# Altium footprint library SMotlaq-PCB_lib.PcbLib: 186 footprints (part 4 of 12)
Each footprint in its own frame and in the unit in brackets; x right, y up, seen from the top. Pads: shape width x height; smd on the part's side, far side on the other; paste and mask are expansions set on the pad; w line width, h text height; cw(c..) or ccw(c..) is an arc to the next point about the centre after c.
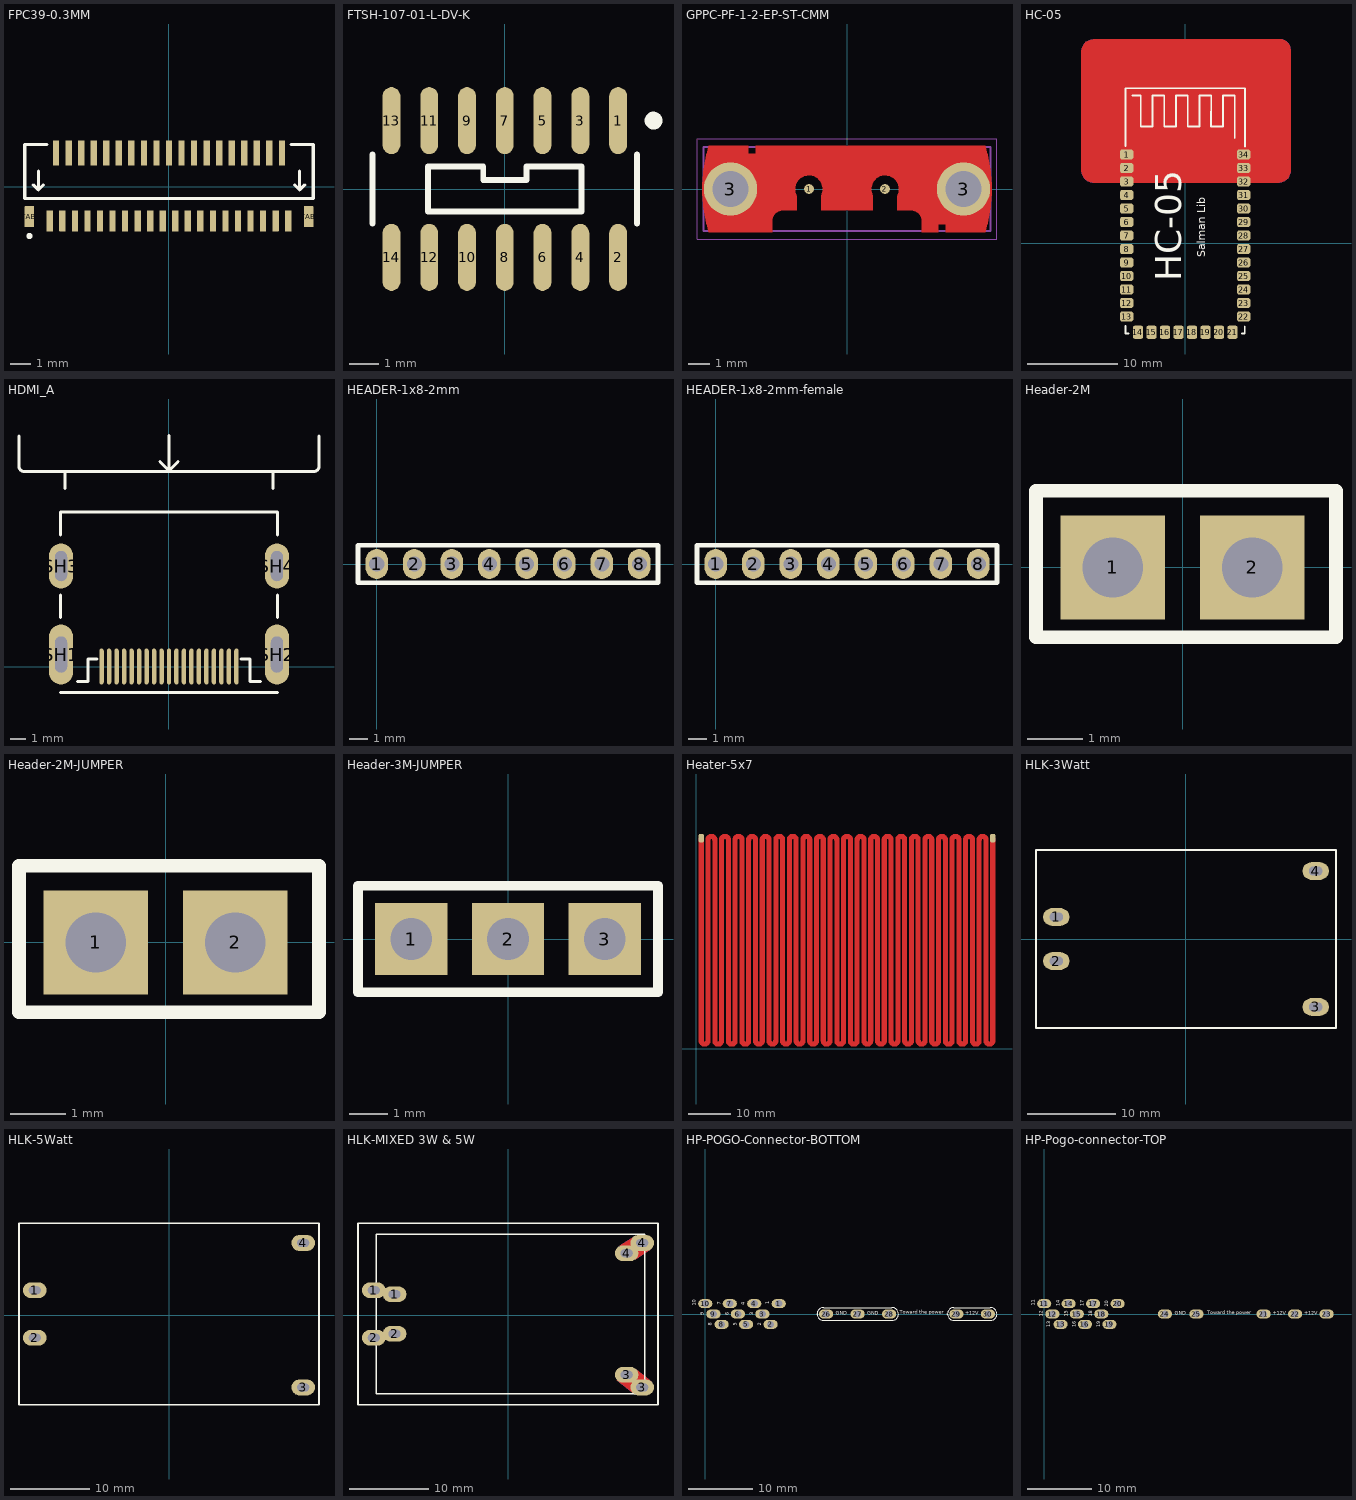
[diagram p3: the footprints below, top view; thin cyan lines are the x and y axes]

## FPC39-0.3MM [mm]
pads (41):
  rrect5% 0.3x1 smd: 1(-5.7,-1.625) 3(-5.1,-1.625) 5(-4.5,-1.625) 7(-3.9,-1.625) 9(-3.3,-1.625) 11(-2.7,-1.625) 13(-2.1,-1.625) 15(-1.5,-1.625) 17(-0.9,-1.625) 19(-0.3,-1.625) 21(0.3,-1.625) 23(0.9,-1.625) 25(1.5,-1.625) 27(2.1,-1.625) 29(2.7,-1.625) 31(3.3,-1.625) 33(3.9,-1.625) 35(4.5,-1.625) 37(5.1,-1.625) 39(5.7,-1.625)
  rrect5% 0.3x1.2 smd: 2(-5.4,1.625) 4(-4.8,1.625) 6(-4.2,1.625) 8(-3.6,1.625) 10(-3,1.625) 12(-2.4,1.625) 14(-1.8,1.625) 16(-1.2,1.625) 18(-0.6,1.625) 20(0,1.625) 22(0.6,1.625) 24(1.2,1.625) 26(1.8,1.625) 28(2.4,1.625) 30(3,1.625) 32(3.6,1.625) 34(4.2,1.625) 36(4.8,1.625) 38(5.4,1.625)
  rrect5% 0.45x1 smd: TAB(-6.675,-1.425) TAB(6.675,-1.425)
Top Overlay:
  circle w0.15: c-6.675,-2.35 r0.075
  lines w0.15: -6.5,0.1 -6.25,-0.15 ; -6.25,0.75 -6.25,-0.15 ; -6,0.1 -6.25,-0.15 ; -5.85,2.025 -6.9,2.025 -6.9,-0.55 6.9,-0.55 6.9,2.025 5.85,2.025 ; 6,0.1 6.25,-0.15 ; 6.25,0.75 6.25,-0.15 ; 6.5,0.1 6.25,-0.15
3D body "502598-3993.stp": height 1.16, standoff 0.01, extent -6.9,-1.775 6.9,2.025

## FTSH-107-01-L-DV-K [mm]
pads (14):
  rrect100% 0.6x2.25 smd mask+0.1: 1(3.81,2.3) 2(3.81,-2.3) 3(2.54,2.3) 4(2.54,-2.3) 5(1.27,2.3) 6(1.27,-2.3) 7(0,2.3) 8(0,-2.3) 9(-1.27,2.3) 10(-1.27,-2.3) 11(-2.54,2.3) 12(-2.54,-2.3) 13(-3.81,2.3) 14(-3.81,-2.3)
Top Overlay:
  circle w0.3: c5,2.3 r0.15
  lines w0.2: -4.45,-1.162 -4.45,1.162 ; 4.45,-1.162 4.45,1.162 ; 2.575,0.75 0.725,0.75 0.725,0.3 -0.725,0.3 -0.725,0.75 -2.575,0.75 -2.575,-0.75 2.575,-0.75 2.575,0.75 ; 2.575,0.75 2.575,0.75
3D body "FTSH-107-01-L-DV-K-TR.stp": height 6.11, standoff -0.01, extent -4.445,-2.921 4.445,2.921

## GPPC-PF-1-2-EP-ST-CMM [mm]
pads (4):
  round 0.46 smd paste-2539.97: 1(-1.78,0) 2(1.78,0)
  round 2.5 hole 1.7: 3(-5.46,0) 3(5.46,0)
Top Layer:
  region: 200 vertices and 0 holes, not listed, extent -6.78,-2.02 6.78,2.02
Top Solder:
  drawing of 1 lines, arcs and shapes, not listed
Mechanical 13:
  lines w0.1: -6.731,-1.97 6.731,-1.97 6.731,1.97 -6.731,1.97 -6.731,-1.97
Mechanical 15:
  lines w0.05: -7.03,-2.36 7.03,-2.36 7.03,2.36 -7.03,2.36 -7.03,-2.36
3D body "GPPC-PF-1-2-EP-ST-CMM.stp": height 6.21, standoff -3.2, extent -6.756,-2.102 6.756,2.102

## HC-05 [mm]
pads (34):
  rrect50% 1.5x1.15 smd: 1(-6.5,9.875) 2(-6.5,8.375) 3(-6.5,6.875) 4(-6.5,5.375) 5(-6.5,3.875) 6(-6.5,2.375) 7(-6.5,0.875) 8(-6.5,-0.625) 9(-6.5,-2.125) 10(-6.5,-3.625) 11(-6.5,-5.125) 12(-6.5,-6.625) 13(-6.5,-8.125) 22(6.5,-8.125) 23(6.5,-6.625) 24(6.5,-5.125) 25(6.5,-3.625) 26(6.5,-2.125) 27(6.5,-0.625) 28(6.5,0.875) 29(6.5,2.375) 30(6.5,3.875) 31(6.5,5.375) 32(6.5,6.875) 33(6.5,8.375) 34(6.5,9.875)
  rrect50% 1.15x1.5 smd: 14(-5.25,-9.875) 15(-3.75,-9.875) 16(-2.25,-9.875) 17(-0.75,-9.875) 18(0.75,-9.875) 19(2.25,-9.875) 20(3.75,-9.875) 21(5.25,-9.875)
Top Layer:
  pour cut-out: 11.75,8.175 11.75,21.375 11.75,21.507 11.699,21.765 11.598,22.009 11.451,22.228 11.265,22.414 11.046,22.56 10.803,22.661 10.544,22.712 10.412,22.712 10.413,22.712 -10.088,22.712 -10.234,22.712 -10.521,22.655 -10.792,22.543 -11.036,22.38 -11.243,22.173 -11.406,21.93 -11.518,21.659 -11.575,21.372 -11.575,21.225 -11.575,8.2 -11.575,8.056 -11.519,7.773 -11.409,7.507 -11.248,7.268 -11.045,7.064 -10.805,6.904 -10.539,6.794 -10.257,6.738 -10.112,6.738 10.312,6.737 10.454,6.737 10.732,6.793 10.993,6.901 11.229,7.058 11.429,7.259 11.586,7.494 11.695,7.756 11.75,8.033
Bottom Layer:
  pour cut-out: 11.75,8.175 11.75,21.375 11.75,21.507 11.699,21.765 11.598,22.009 11.451,22.228 11.265,22.414 11.046,22.56 10.803,22.661 10.544,22.712 10.412,22.712 10.413,22.712 -10.088,22.712 -10.234,22.712 -10.521,22.655 -10.792,22.543 -11.036,22.38 -11.243,22.173 -11.406,21.93 -11.518,21.659 -11.575,21.372 -11.575,21.225 -11.575,8.2 -11.575,8.056 -11.519,7.773 -11.409,7.507 -11.248,7.268 -11.045,7.064 -10.805,6.904 -10.539,6.794 -10.257,6.738 -10.112,6.738 10.312,6.737 10.454,6.737 10.732,6.793 10.993,6.901 11.229,7.058 11.429,7.259 11.586,7.494 11.695,7.756 11.75,8.033
Top Overlay:
  lines w0.2: -6.65,10.825 -6.65,17.25 6.65,17.25 6.65,10.75 ; -6.625,-9.175 -6.625,-10 -6.3,-10 ; -5.85,16.45 -4.95,16.45 -4.95,12.975 -3.644,12.975 ; -3.644,13 -3.644,16.45 -2.338,16.45 -2.338,13 -1.025,13 ; -1.025,12.975 -1.031,16.45 0.275,16.45 ; 1.581,16.45 1.6,12.975 ; 2.875,12.975 2.887,16.45 ; 5.5,11.675 5.5,16.45 4.194,16.45 4.194,12.975 2.887,12.975 2.887,16.45 ; 6.275,-10 6.625,-10 6.625,-9.225 ; 0.275,12.975 0.275,16.45 ; 0.275,12.975 0.275,16.45 ; 0.275,12.975 1.6,12.975 ; 1.6,12.975 1.6,16.45 2.887,16.45
  text "HC-05" at 0.544,-4.225 h5
  text "Salman Lib" at 2.558,-1.55 h1.5
3D body "User Library-HC05(06).STEP": height 4.31, standoff 0, extent -6.5,-9.875 6.5,17.125

## HDMI_A [mm] "CONN, HDMI, TYPE A, 19PIN"
pads (23):
  oval 0.3x2.4 smd mask+0.025: 1(-4.5,0) 2(-4,0) 3(-3.5,0) 4(-3,0) 5(-2.5,0) 6(-2,0) 7(-1.5,0) 8(-1,0) 9(-0.5,0) 10(0,0) 11(0.5,0) 12(1,0) 13(1.5,0) 14(2,0) 15(2.5,0) 16(3,0) 17(3.5,0) 18(4,0) 19(4.5,0)
  oval 1.6x4 hole 0.8 slot 2.4 at 90 deg: SH1(-7.2,0.8) SH2(7.2,0.8)
  oval 1.6x3 hole 0.8 slot 2 at 90 deg: SH3(-7.2,6.7) SH4(7.2,6.7)
Top Overlay:
  lines w0.2: -10,13.31 -10,15.36 ; -10,13.36 ccw(c-9.675,13.335) -9.7,13.01 9.7,13.01 ccw(c9.675,13.335) 10,13.36 10,15.36 ; -7.25,-1.74 7.25,-1.74 ; -7.25,3.26 -7.25,4.76 ; -7.25,8.76 -7.25,10.26 ; -7.25,10.31 7.2,10.31 7.25,10.26 7.25,8.76 ; -6.95,11.86 -6.95,13.01 ; -6.1,-1 -5.4,-1 -5.4,0.5 -4.8,0.5 ; -0.6,13.66 0,13.06 ; 0,15.41 0,13.06 ; 0.6,13.66 0,13.06 ; 4.8,0.5 5.4,0.5 5.4,-1 6.1,-1 ; 6.95,11.86 6.95,13.01 ; 7.25,3.26 7.25,4.76
3D body "685119134923.stp": height 6.17, standoff -2.21, extent -7.5,-0.75 7.5,11.4

## HEADER-1x8-2mm [mm]
pads (8):
  oval 1.2x1.6 hole 0.8: 1(0,0) 2(2,0) 3(4,0) 4(6,0) 5(8,0) 6(10,0) 7(12,0) 8(14,0)
Top Overlay:
  lines w0.254: -1,-1 -1,1 15,1 15,-1 -1,-1
3D body "pin_header_a-sl200-eg-g08d.stp": height 2.4, standoff -6.4, extent -0.95,-1.025 15,0.975

## HEADER-1x8-2mm-female [mm]
pads (8):
  oval 1.2x1.6 hole 0.8: 1(0,0) 2(2,0) 3(4,0) 4(6,0) 5(8,0) 6(10,0) 7(12,0) 8(14,0)
Top Overlay:
  lines w0.254: -1,-1 15,-1 15,1 -1,1 -1,-1
3D body "female_header_a-bl200-eg-g08d.stp": height 4.06, standoff -2.74, extent -1.25,-1.25 15.25,1.25

## Header-2M [mm]
pads (2):
  rect 1.9x1.9 hole 1.1: 1(-1.27,0) 2(1.27,0)
Top Overlay:
  lines w0.254: -2.667,-1.27 -2.667,1.397 2.794,1.397 2.794,-1.27 -2.667,-1.27
3D body "pin_header_aw140-eg-g02d.stp": height 8.2, standoff -3, extent -2.44,-1.246 2.64,1.253

## Header-2M-JUMPER [mm]
pads (2):
  rect 1.9x1.9 hole 1.1: 1(-1.27,0) 2(1.27,0)
Top Overlay:
  lines w0.254: -2.667,-1.27 -2.667,1.397 2.794,1.397 2.794,-1.27 -2.667,-1.27
3D body "pin_header_aw140-eg-g02d.stp": height 8.2, standoff -3, extent -2.44,-1.246 2.64,1.253
3D body "jumper_akspt_g-black.stp": height 8.57, standoff 2.6, extent -2.39,-1.216 2.59,1.224

## Header-3M-JUMPER [mm]
pads (3):
  rect 1.9x1.9 hole 1.1: 1(-2.54,0) 2(0,0) 3(2.54,0)
Top Overlay:
  lines w0.254: -3.937,-1.397 3.937,-1.397 3.937,1.397 -3.937,1.397 -3.937,-1.397
3D body "User Library-Header_Male_3Pin.STEP": height 8.54, standoff -3, extent -3.81,-1.245 3.81,1.245
3D body "jumper_akspt_g-black.stp": height 8.37, standoff 2.4, extent -3.76,-1.22 1.22,1.22

## Heater-5x7 [mm]
pads (2):
  rrect50% 1.2x2 smd mask+0.102: 1(1.125,49.675) 2(69.925,49.675)
Top Layer:
  lines w1.2: 1.125,49.3 1.125,1.875 ccw(c1.925,1.875) 1.925,1.075 ccw(c1.925,1.875) 2.725,1.875 2.725,49.3 cw(c3.525,49.3) 3.525,50.1 cw(c3.525,49.3) 4.325,49.3 4.325,1.875 ccw(c5.125,1.875) 5.125,1.075 ccw(c5.125,1.875) 5.925,1.875 5.925,49.3 cw(c6.725,49.3) 6.725,50.1 cw(c6.725,49.3) 7.525,49.3 7.525,1.875 ccw(c8.325,1.875) 8.325,1.075 ccw(c8.325,1.875) 9.125,1.875 9.125,49.3 cw(c9.925,49.3) 9.925,50.1 cw(c9.925,49.3) 10.725,49.3 10.725,1.875 ccw(c11.525,1.875) 11.525,1.075 ccw(c11.525,1.875) 12.325,1.875 12.325,49.3 cw(c13.125,49.3) 13.125,50.1 cw(c13.125,49.3) 13.925,49.3 13.925,1.875 ccw(c14.725,1.875) 14.725,1.075 ccw(c14.725,1.875) 15.525,1.875 15.525,49.3 cw(c16.325,49.3) 16.325,50.1 cw(c16.325,49.3) 17.125,49.3 17.125,1.875 ccw(c17.925,1.875) 17.925,1.075 ccw(c17.925,1.875) 18.725,1.875 18.725,49.3 cw(c19.525,49.3) 19.525,50.1 cw(c19.525,49.3) 20.325,49.3 20.325,1.875 ccw(c21.125,1.875) 21.125,1.075 ccw(c21.125,1.875) 21.925,1.875 21.925,49.3 cw(c22.725,49.3) 22.725,50.1 cw(c22.725,49.3) 23.525,49.3 23.525,1.875 ccw(c24.325,1.875) 24.325,1.075 ccw(c24.325,1.875) 25.125,1.875 25.125,49.3 cw(c25.925,49.3) 25.925,50.1 cw(c25.925,49.3) 26.725,49.3 26.725,1.875 ccw(c27.525,1.875) 27.525,1.075 ccw(c27.525,1.875) 28.325,1.875 28.325,49.3 cw(c29.125,49.3) 29.125,50.1 cw(c29.125,49.3) 29.925,49.3 29.925,1.875 ccw(c30.725,1.875) 30.725,1.075 ccw(c30.725,1.875) 31.525,1.875 31.525,49.3 cw(c32.325,49.3) 32.325,50.1 cw(c32.325,49.3) 33.125,49.3 33.125,1.875 ccw(c33.925,1.875) 33.925,1.075 ccw(c33.925,1.875) 34.725,1.875 34.725,49.3 cw(c35.525,49.3) 35.525,50.1 cw(c35.525,49.3) 36.325,49.3 36.325,1.875 ccw(c37.125,1.875) 37.125,1.075 ccw(c37.125,1.875) 37.925,1.875 37.925,49.3 cw(c38.725,49.3) 38.725,50.1 cw(c38.725,49.3) 39.525,49.3 39.525,1.875 ccw(c40.325,1.875) 40.325,1.075 ccw(c40.325,1.875) 41.125,1.875 41.125,49.3 cw(c41.925,49.3) 41.925,50.1 cw(c41.925,49.3) 42.725,49.3 42.725,1.875 ccw(c43.525,1.875) 43.525,1.075 ccw(c43.525,1.875) 44.325,1.875 44.325,49.3 cw(c45.125,49.3) 45.125,50.1 cw(c45.125,49.3) 45.925,49.3 45.925,1.875 ccw(c46.725,1.875) 46.725,1.075 ccw(c46.725,1.875) 47.525,1.875 47.525,49.3 cw(c48.325,49.3) 48.325,50.1 cw(c48.325,49.3) 49.125,49.3 49.125,1.875 ccw(c49.925,1.875) 49.925,1.075 ccw(c49.925,1.875) 50.725,1.875 50.725,49.3 cw(c51.525,49.3) 51.525,50.1 cw(c51.525,49.3) 52.325,49.3 52.325,1.875 ccw(c53.125,1.875) 53.125,1.075 ccw(c53.125,1.875) 53.925,1.875 53.925,49.3 cw(c54.725,49.3) 54.725,50.1 cw(c54.725,49.3) 55.525,49.3 55.525,1.875 ccw(c56.325,1.875) 56.325,1.075 ccw(c56.325,1.875) 57.125,1.875 57.125,49.3 cw(c57.925,49.3) 57.925,50.1 cw(c57.925,49.3) 58.725,49.3 58.725,1.875 ccw(c59.525,1.875) 59.525,1.075 ccw(c59.525,1.875) 60.325,1.875 60.325,49.3 cw(c61.125,49.3) 61.125,50.1 cw(c61.125,49.3) 61.925,49.3 61.925,1.875 ccw(c62.725,1.875) 62.725,1.075 ccw(c62.725,1.875) 63.525,1.875 63.525,49.3 cw(c64.325,49.3) 64.325,50.1 cw(c64.325,49.3) 65.125,49.3 65.125,1.875 ccw(c65.925,1.875) 65.925,1.075 ccw(c65.925,1.875) 66.725,1.875 66.725,49.3 cw(c67.525,49.3) 67.525,50.1 cw(c67.525,49.3) 68.325,49.3 68.325,1.875 ccw(c69.125,1.875) 69.125,1.075 ccw(c69.125,1.875) 69.925,1.875 69.925,49.3

## HLK-3Watt [mm]
pads (4):
  oval 3x2 / inner oval 3x2 / far side oval 3.5x2.2 hole 1 slot 1.5 at 0 deg: 1(-14.7,2.5) 2(-14.7,-2.5) 3(14.7,-7.7) 4(14.7,7.7)
Top Overlay:
  lines w0.2: -17,-10.1 17,-10.1 17,10.1 -17,10.1 -17,-10.1
3D body "User Library-HLK-PM01.STEP": height 15.1, standoff -5, extent -16.95,-10.15 17.05,10.05

## HLK-5Watt [mm]
pads (4):
  oval 3x2 hole 1 slot 1.5 at 0 deg: 1(-17,3.15) 2(-17,-2.85) 3(17,-9.15) 4(17,9.15)
Top Overlay:
  lines w0.2: -19,-11.35 19,-11.35 19,11.65 -19,11.65 -19,-11.35
3D body "User Library-HLK-5M05.STEP": height 18, standoff -5, extent -18.975,-11.325 19.025,11.675

## HLK-MIXED 3W & 5W [mm]
pads (8):
  oval 3x2 hole 1 slot 1.5 at 0 deg: 1(-17,3.15) 1(-14.375,2.65) 2(-17,-2.85) 2(-14.375,-2.35) 3(15.025,-7.55) 3(17,-9.15) 4(15.025,7.85) 4(17,9.15)
Top Layer:
  region: 15.8,-9.85 13.8,-8.25 15.775,-8.25
  region: 16.225,-6.85 18.225,-8.45 16.25,-8.45
  region: 18,8.3 16.125,7.05 16.15,8.325
  region: 14.025,8.7 15.9,9.95 15.875,8.675
Bottom Layer:
  region: 14.025,8.7 15.9,9.95 15.875,8.675
  region: 18,8.3 16.125,7.05 16.15,8.325
  region: 15.85,-9.9 13.85,-8.3 15.825,-8.3
  region: 16.275,-6.9 18.275,-8.5 16.3,-8.5
Top Overlay:
  lines w0.2: -19,-11.35 -19,11.65 19,11.65 19,-11.35 -19,-11.35 ; -16.675,-9.95 -16.675,10.25 17.325,10.25 17.325,-9.95 -16.675,-9.95
3D body "User Library-HLK-5M05.STEP": height 18, standoff -5, extent -18.975,-11.325 19.025,11.675

## HP-POGO-Connector-BOTTOM [mm]
pads (15):
  oval 2.2x1.4 hole 1.1: 1(11.43,1.615) 2(10.16,-1.615) 3(8.89,0) 4(7.62,1.615) 5(6.35,-1.615) 6(5.08,0) 7(3.81,1.615) 8(2.54,-1.615) 9(1.27,0) 10(0,1.615) 26(18.8,0) 27(23.7,0) 28(28.6,0) 29(39.06,0) 30(43.965,0)
Top Overlay:
  lines w0.15: 17.408,0 ccw(c18.383,0) 18.383,-0.975 ; 17.408,0 ccw(c18.383,0) 18.383,-0.975 ; 17.408,0 17.408,0.013 ; 17.408,0 17.408,0.013 ; 17.408,0.013 cw(c18.395,0.013) 18.395,1 ; 17.408,0.013 cw(c18.395,0.013) 18.395,1 ; 18.383,-0.975 29.12,-0.975 ; 18.383,-0.975 29.12,-0.975 ; 18.395,1 29.045,1 ; 18.395,1 29.045,1 ; 29.045,1 cw(c29.045,-0.025) 30.07,-0.025 ; 29.045,1 cw(c29.045,-0.025) 30.07,-0.025 ; 29.12,-0.975 ccw(c29.12,-0.025) 30.07,-0.025 ; 29.12,-0.975 ccw(c29.12,-0.025) 30.07,-0.025 ; 37.672,0 ccw(c38.647,0) 38.647,-0.975 ; 37.672,0 ccw(c38.647,0) 38.647,-0.975 ; 37.672,0 37.672,0.013 ; 37.672,0 37.672,0.013 ; 37.672,0.013 cw(c38.66,0.013) 38.66,1 ; 37.672,0.013 cw(c38.66,0.013) 38.66,1 ; 38.647,-0.975 44.435,-0.975 ; 38.647,-0.975 44.435,-0.975 ; 38.66,1 44.36,1 ; 38.66,1 44.36,1 ; 44.36,1 cw(c44.36,-0.025) 45.385,-0.025 ; 44.36,1 cw(c44.36,-0.025) 45.385,-0.025 ; 44.435,-0.975 ccw(c44.435,-0.025) 45.385,-0.025 ; 44.435,-0.975 ccw(c44.435,-0.025) 45.385,-0.025
  text "GND" at 25.2,-0.32 h1
  text "10" at -1.286,1.25 h1
  text "9" at -0.011,-0.21 h1
  text "8" at 1.214,-1.826 h1
  text "1" at 10.225,1.497 h1
  text "GND" at 20.3,-0.32 h1
  text "+12V" at 40.475,-0.321 h1
  text "7" at 2.65,1.408 h1
  text "6" at 3.889,-0.212 h1
  text "5" at 5.139,-1.827 h1
  text "4" at 6.4,1.393 h1
  text "3" at 7.689,-0.209 h1
  text "2" at 8.95,-1.828 h1
  text "Toward the power" at 30.275,-0.231 h1
3D body "User Library-PL75-B1.step": height 9.4, standoff -25, extent -0.5,1.115 0.5,2.115
3D body "User Library-PL75-B1.step": height 9.4, standoff -25, extent 0.77,-0.5 1.77,0.5
3D body "User Library-PL75-B1.step": height 9.4, standoff -25, extent 2.04,-2.115 3.04,-1.115
3D body "User Library-PL75-B1.step": height 9.4, standoff -25, extent 3.31,1.115 4.31,2.115
3D body "User Library-PL75-B1.step": height 9.4, standoff -25, extent 4.58,-0.5 5.58,0.5
3D body "User Library-PL75-B1.step": height 9.4, standoff -25, extent 5.85,-2.115 6.85,-1.115
3D body "User Library-PL75-B1.step": height 9.4, standoff -25, extent 9.66,-2.115 10.66,-1.115
3D body "User Library-PL75-B1.step": height 9.4, standoff -25, extent 8.39,-0.5 9.39,0.5
3D body "User Library-PL75-B1.step": height 9.4, standoff -25, extent 7.12,1.115 8.12,2.115
3D body "User Library-PL75-B1.step": height 9.4, standoff -25, extent 10.93,1.115 11.93,2.115
3D body "User Library-PL75-B1.step": height 9.4, standoff -25, extent 18.3,-0.5 19.3,0.5
3D body "User Library-PL75-B1.step": height 9.4, standoff -25, extent 23.2,-0.5 24.2,0.5
3D body "User Library-PL75-B1.step": height 9.4, standoff -25, extent 28.1,-0.5 29.1,0.5
3D body "User Library-PL75-B1.step": height 9.4, standoff -25, extent 38.56,-0.5 39.56,0.5
3D body "User Library-PL75-B1.step": height 9.4, standoff -25, extent 43.465,-0.5 44.465,0.5

## HP-Pogo-connector-TOP [mm]
pads (15):
  oval 2.2x1.4 hole 1.1: 11(0,1.615) 12(1.27,0) 13(2.54,-1.615) 14(3.81,1.615) 15(5.08,0) 16(6.35,-1.615) 17(7.62,1.615) 18(8.89,0) 19(10.16,-1.615) 20(11.43,1.615) 21(34.155,0) 22(39.06,0) 23(43.965,0) 24(18.8,0) 25(23.7,0)
Top Overlay:
  text "11" at -1.275,1.25 h1
  text "12" at 0,-0.425 h1
  text "13" at 1.214,-2.05 h1
  text "20" at 10.214,1.149 h1
  text "GND" at 20.3,-0.32 h1
  text "+12V" at 35.6,-0.321 h1
  text "+12V" at 40.475,-0.321 h1
  text "14" at 2.65,1.2 h1
  text "15" at 3.889,-0.425 h1
  text "16" at 5.139,-2.05 h1
  text "17" at 6.4,1.175 h1
  text "18" at 7.689,-0.425 h1
  text "19" at 8.939,-2.05 h1
  text "Toward the power" at 25.4,-0.247 h1
Bottom Overlay:
  lines w0.15: 17.413,0 ccw(c18.387,0) 18.387,-0.975 ; 17.413,0 ccw(c18.387,0) 18.387,-0.975 ; 17.413,0 17.413,0.013 ; 17.413,0 17.413,0.013 ; 17.413,0.013 cw(c18.4,0.013) 18.4,1 ; 17.413,0.013 cw(c18.4,0.013) 18.4,1 ; 18.387,-0.975 24.175,-0.975 ; 18.387,-0.975 24.175,-0.975 ; 18.4,1 24.1,1 ; 18.4,1 24.1,1 ; 24.1,1 cw(c24.1,-0.025) 25.125,-0.025 ; 24.1,1 cw(c24.1,-0.025) 25.125,-0.025 ; 24.175,-0.975 ccw(c24.175,-0.025) 25.125,-0.025 ; 24.175,-0.975 ccw(c24.175,-0.025) 25.125,-0.025 ; 32.762,0 ccw(c33.737,0) 33.737,-0.975 ; 32.762,0 ccw(c33.737,0) 33.737,-0.975 ; 32.762,0 32.762,0.013 ; 32.762,0 32.762,0.013 ; 32.762,0.013 cw(c33.75,0.013) 33.75,1 ; 32.762,0.013 cw(c33.75,0.013) 33.75,1 ; 33.737,-0.975 44.475,-0.975 ; 33.737,-0.975 44.475,-0.975 ; 33.75,1 44.4,1 ; 33.75,1 44.4,1 ; 44.4,1 cw(c44.4,-0.025) 45.425,-0.025 ; 44.4,1 cw(c44.4,-0.025) 45.425,-0.025 ; 44.475,-0.975 ccw(c44.475,-0.025) 45.425,-0.025 ; 44.475,-0.975 ccw(c44.475,-0.025) 45.425,-0.025
  text "+12V" at 42.532,-0.321 h1
  text "+12V" at 37.657,-0.321 h1
  text "20" at 10.214,2.077 h1
  text "19" at 8.939,-1.192 h1
  text "18" at 7.689,0.433 h1
  text "17" at 6.4,2.032 h1
  text "14" at 2.65,2.054 h1
  text "15" at 3.889,0.437 h1
  text "16" at 5.139,-1.193 h1
  text "13" at 1.214,-1.193 h1
  text "12" at 0,0.426 h1
  text "11" at -1.275,1.983 h1
  text "GND" at 22.192,-0.32 h1
3D body "User Library-PL75-B1.step": height 9.4, standoff -25, extent 43.465,-0.5 44.465,0.5
3D body "User Library-PL75-B1.step": height 9.4, standoff -25, extent 38.56,-0.5 39.56,0.5
3D body "User Library-PL75-B1.step": height 9.4, standoff -25, extent 33.655,-0.5 34.655,0.5
3D body "User Library-PL75-B1.step": height 9.4, standoff -25, extent 23.2,-0.5 24.2,0.5
3D body "User Library-PL75-B1.step": height 9.4, standoff -25, extent 18.3,-0.5 19.3,0.5
3D body "User Library-PL75-B1.step": height 9.4, standoff -25, extent -0.5,1.115 0.5,2.115
3D body "User Library-PL75-B1.step": height 9.4, standoff -25, extent 0.77,-0.5 1.77,0.5
3D body "User Library-PL75-B1.step": height 9.4, standoff -25, extent 2.04,-2.115 3.04,-1.115
3D body "User Library-PL75-B1.step": height 9.4, standoff -25, extent 3.31,1.115 4.31,2.115
3D body "User Library-PL75-B1.step": height 9.4, standoff -25, extent 4.58,-0.5 5.58,0.5
3D body "User Library-PL75-B1.step": height 9.4, standoff -25, extent 5.85,-2.115 6.85,-1.115
3D body "User Library-PL75-B1.step": height 9.4, standoff -25, extent 7.12,1.115 8.12,2.115
3D body "User Library-PL75-B1.step": height 9.4, standoff -25, extent 8.39,-0.5 9.39,0.5
3D body "User Library-PL75-B1.step": height 9.4, standoff -25, extent 9.66,-2.115 10.66,-1.115
3D body "User Library-PL75-B1.step": height 9.4, standoff -25, extent 10.93,1.115 11.93,2.115